# Altium footprint library Chronos.PcbLib: 65 footprints (part 4 of 5)
Each footprint in its own frame and in the unit in brackets; x right, y up, seen from the top. Pads: shape width x height; smd on the part's side, far side on the other; paste and mask are expansions set on the pad; w line width, h text height; cw(c..) or ccw(c..) is an arc to the next point about the centre after c.
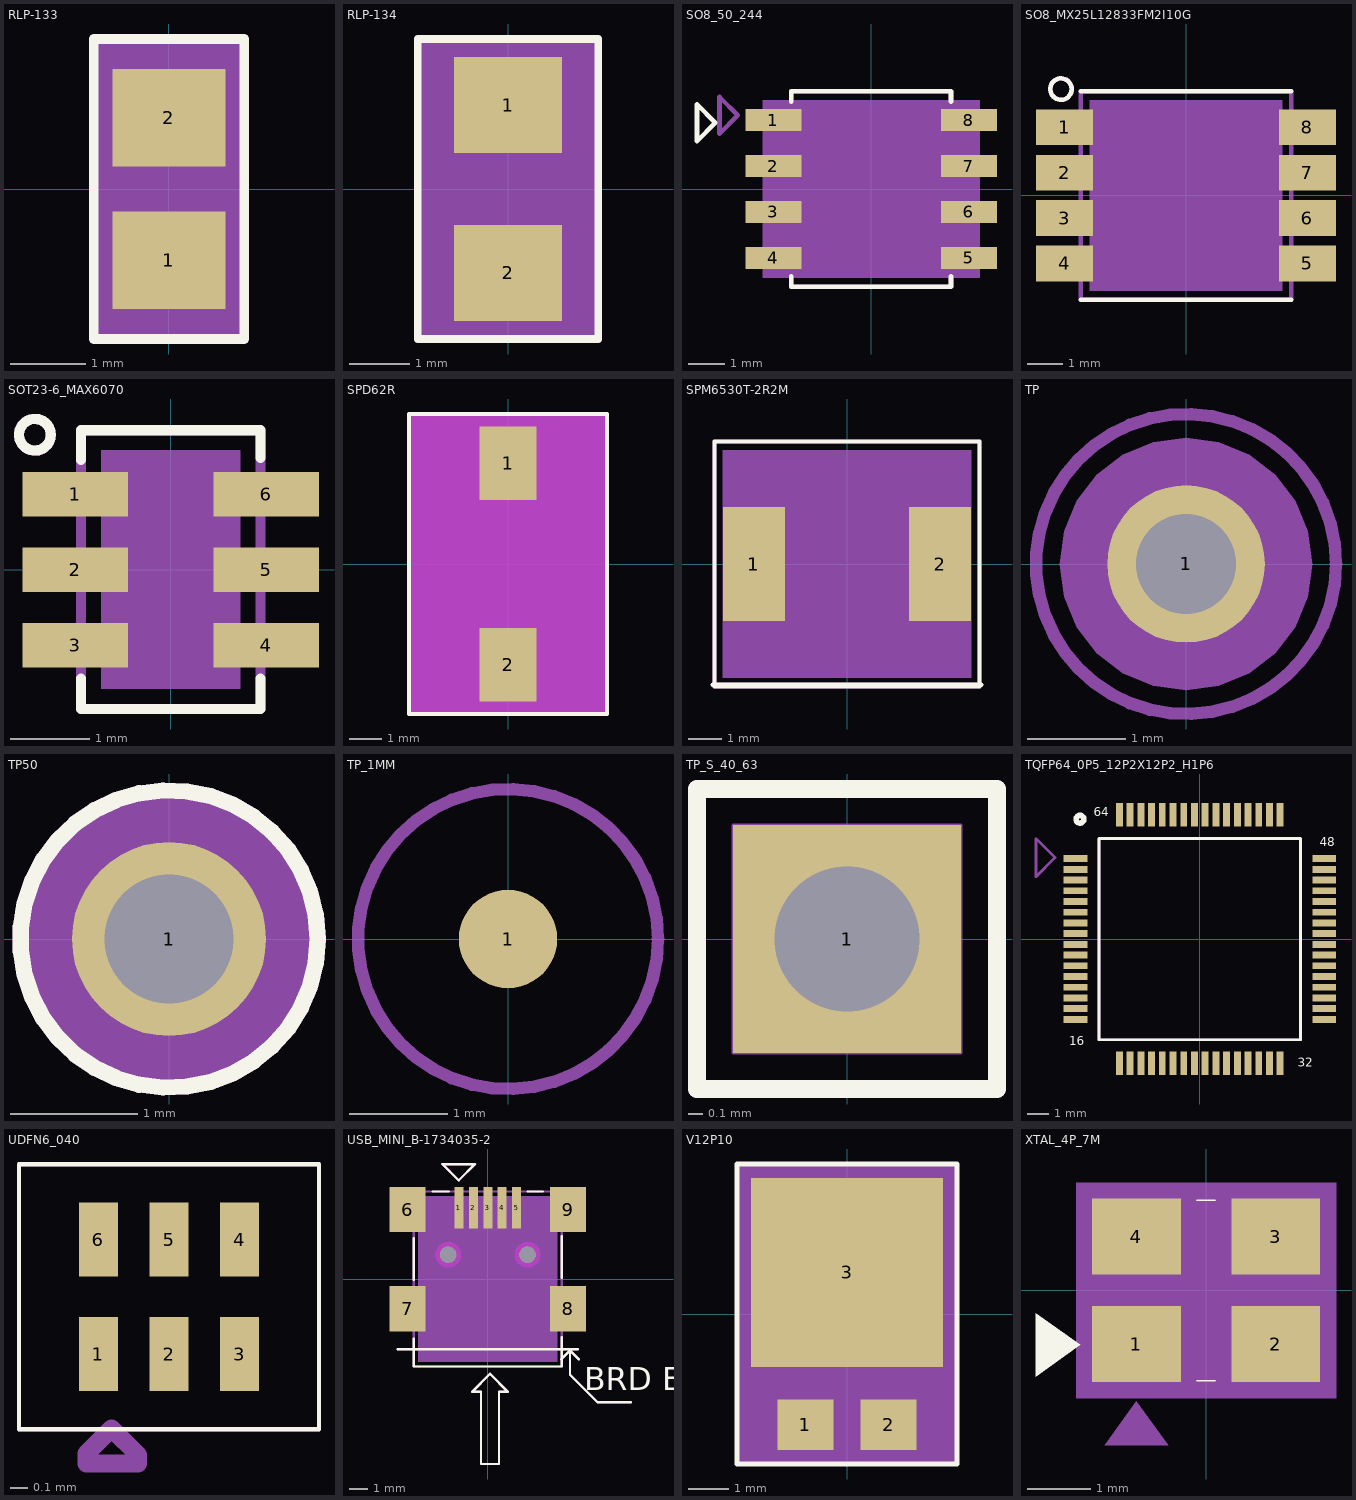
[diagram p3: the footprints below, top view; thin cyan lines are the x and y axes]

## RLP-133 [mm] "RLP-133"
pads (2):
  rect 1.5x1.3 smd: 1(0,-0.95) 2(0,0.95)
Top Overlay:
  lines w0.127: -1.001,-1.999 1.001,-1.999 1.001,1.999 -1.001,1.999 -1.001,-1.999
Top 3D Body:
  region: 1.001,1.999 1.001,-1.999 -1.001,-1.999 -1.001,1.999
Mechanical 29:
  text "2" at 0,0.442 h0.64
  text "1" at 0,-1.458 h0.64
3D body "CAP 0805.STEP": height 1.27, standoff 0, extent -0.637,-1 0.637,1

## RLP-134 [mm] "RLP-134"
pads (2):
  rect 1.8x1.6 smd: 1(0,1.399) 2(0,-1.399)
Top Overlay:
  lines w0.127: -1.501,-2.499 1.501,-2.499 1.501,2.499 -1.501,2.499 -1.501,-2.499
Top 3D Body:
  region: -1.501,-2.499 -1.501,2.499 1.501,2.499 1.501,-2.499
Mechanical 29:
  text "2" at 0,-1.907 h0.64
  text "1" at 0,0.891 h0.64
3D body "CAP 1206.STEP": height 1.65, standoff 0.03, extent -0.862,-1.6 0.762,1.6

## SO8_50_244 [mm] "SO8_50_244"
pads (8):
  rect 1.55x0.6 smd: 1(-2.7,1.905) 2(-2.7,0.635) 3(-2.7,-0.635) 4(-2.7,-1.905) 5(2.7,-1.905) 6(2.7,-0.635) 7(2.7,0.635) 8(2.7,1.905)
Top Overlay:
  lines w0.127: -2.204,-2.413 -2.204,-2.704 2.204,-2.704 2.204,-2.413 ; -2.204,2.413 -2.204,2.704 2.204,2.704 2.204,2.413 ; -4.811,1.321 -4.811,2.337 -4.303,1.829 -4.811,1.321
  text ".Designator" at -5.185,0.694 h1.02
Top 3D Body:
  region: -3,2.45 -3,-2.45 3,-2.45 3,2.45
Top Assembly:
  lines w0.127: -2.204,-2.413 -2.204,-2.704 2.204,-2.704 2.204,-2.413 ; -2.204,2.413 -2.204,2.704 2.204,2.704 2.204,2.413 ; -4.191,1.524 -4.191,2.54 -3.683,2.032 -4.191,1.524
Mechanical 29:
  text "4" at -2.497,-1.905 h0.51
  text "6" at 2.903,-0.635 h0.51
  text "8" at 2.903,1.905 h0.51
  text "1" at -2.497,1.905 h0.51
  text "2" at -2.497,0.635 h0.51
  text "3" at -2.497,-0.635 h0.51
  text "5" at 2.903,-1.905 h0.51
  text "7" at 2.903,0.635 h0.51
3D body "93LC56C-I_SN.STEP": height 1.75, standoff 0, extent -3,-2.45 3,2.45

## SO8_MX25L12833FM2I10G [mm] "SO8_MX25L12833FM2I10G"
pads (8):
  rect 1.6x1 smd: 1(-3.4,1.905) 2(-3.4,0.635) 3(-3.4,-0.635) 4(-3.4,-1.905) 5(3.4,-1.905) 6(3.4,-0.635) 7(3.4,0.635) 8(3.4,1.905)
Top Overlay:
  circle w0.127: c-3.502,2.976 r0.3
  lines w0.127: -2.944,-2.919 2.944,-2.919 ; -2.944,2.919 2.944,2.919
  text ".Designator" at 5.498,-2.6 h1.02
Top 3D Body:
  region: -2.69,2.665 -2.69,-2.665 2.69,-2.665 2.69,2.665
Top Assembly:
  circle w0.127: c-3.502,2.976 r0.3
  lines w0.127: -2.944,-2.919 2.944,-2.919 2.944,2.919 -2.944,2.919 -2.944,-2.919
Mechanical 29:
  text "4" at -3.4,-2.108 h0.51
  text "8" at 3.4,1.702 h0.51
  text "6" at 3.4,-0.838 h0.51
  text "3" at -3.4,-0.838 h0.51
  text "7" at 3.4,0.432 h0.51
  text "2" at -3.4,0.432 h0.51
  text "5" at 3.4,-2.108 h0.51
  text "1" at -3.4,1.702 h0.51
3D body "SOP-8.step": height 1.83, standoff 0, extent -3.227,-2.5 2.973,2.5

## SOT23-6_MAX6070 [mm] "SOT23-6_MAX6070"
pads (6):
  rect 1.33x0.56 smd: 1(-1.2,0.95) 2(-1.2,0) 3(-1.2,-0.95) 4(1.2,-0.95) 5(1.2,0) 6(1.2,0.95)
Top Overlay:
  circle w0.127: c-1.708,1.697 r0.2
  lines w0.127: -1.129,-1.369 -1.129,-1.754 1.129,-1.754 1.129,-1.369 ; -1.129,1.378 -1.129,1.754 1.129,1.754 1.129,1.402
  text ".Designator" at 0.603,-2.127 h1.02
Top 3D Body:
  region: 0.875,-1.5 0.875,1.5 -0.875,1.5 -0.875,-1.5
Top Assembly:
  circle w0.127: c-1.708,1.697 r0.2
  lines w0.127: -1.129,-1.754 -1.129,1.754 1.129,1.754 1.129,-1.754 -1.129,-1.754
Mechanical 29:
  text "6" at 1.2,0.747 h0.51
  text "5" at 1.2,-0.203 h0.51
  text "1" at -1.2,0.747 h0.51
  text "3" at -1.2,-1.153 h0.51
  text "4" at 1.2,-1.153 h0.51
  text "2" at -1.2,-0.203 h0.51
3D body: height 3.81, standoff 0, extent -0.875,-1.5 0.875,1.5

## SPD62R [mm] "SPD62R"
pads (2):
  rect 1.8x2.3 smd: 1(0,3.15) 2(0,-3.15)
Mid-Layer 1 keep-out:
  region: -3.048,4.699 -3.048,-4.699 3.048,-4.699 3.048,4.699
Mid-Layer 2 keep-out:
  region: -3.048,4.699 -3.048,-4.699 3.048,-4.699 3.048,4.699
Top Overlay:
  lines w0.127: -3.099,-4.699 -3.099,4.699 3.099,4.699 3.099,-4.699 -3.099,-4.699
Top 3D Body:
  region: -3.099,4.699 -3.099,-4.699 3.099,-4.699 3.099,4.699
Mechanical 29:
  text "2" at -0.508,-3.15 h0.64
  text "1" at -0.508,3.15 h0.64
3D body "Download_WE-PD_6033_STP+(rev1) (1).stp": height 2.9, standoff 0, extent -3.1,-2.823 3.1,3.077

## SPM6530T-2R2M [mm] "SPM6530T-2R2M"
pads (2):
  rect 1.85x3.4 smd: 1(-2.775,0) 2(2.775,0)
Top Overlay:
  lines w0.127: -4.004,-3.604 4.004,-3.604 ; -3.954,-3.654 -3.954,3.654 3.954,3.654 3.954,-3.654 -3.954,-3.654
  text ".Designator" at 2.612,-4.01 h1.02
Top 3D Body:
  region: 3.7,-3.4 3.7,3.4 -3.7,3.4 -3.7,-3.4
Top Assembly:
  lines w0.127: -4.004,-3.604 4.004,-3.604 ; -3.954,-3.654 -3.954,3.654 3.954,3.654 3.954,-3.654 -3.954,-3.654
Mechanical 29:
  text "2" at 2.775,-0.203 h0.51
  text "1" at -2.775,-0.203 h0.51
3D body "Bourns SRR6028.STEP": height 2.7, standoff -0.1, extent -3.4,-3.4 3.4,3.4

## TP [mil] "TP"
pads (1):
  round 63 hole 40: 1(0,0)
Top 3D Body:
  region: 0,-50.43 13.05,-48.71 25.22,-43.67 35.66,-35.66 43.67,-25.22 48.71,-13.05 50.43,0 48.71,13.05 43.67,25.22 35.66,35.66 25.22,43.67 13.05,48.71 0,50.43 -13.05,48.71 -25.22,43.67 -35.66,35.66 -43.67,25.22 -48.71,13.05 -50.43,0 -48.71,-13.05 -43.67,-25.22 -35.66,-35.66 -25.22,-43.67 -13.05,-48.71
Top Assembly:
  circle w5: c0,0 r60
  text ".Designator" at 100,100 h40
Mechanical 29:
  text "1" at 0,20 h25
Mechanical39:
  circle w5: c0,0 r60
3D body: height 150, standoff 0, extent -50.43,-50.43 50.43,50.43

## TP50 [mil] "TP50"
pads (1):
  round 60 hole 40: 1(0,0)
Top Overlay:
  circle w5: c0,0 r45.96
Top 3D Body:
  region: 0,46.36 -12,44.78 -23.18,40.15 -32.78,32.78 -40.15,23.18 -44.78,12 -46.36,0 -44.78,-12 -40.15,-23.18 -32.78,-32.78 -23.18,-40.15 -12,-44.78 0,-46.36 12,-44.78 23.18,-40.15 32.78,-32.78 40.15,-23.18 44.78,-12 46.36,0 44.78,12 40.15,23.18 32.78,32.78 23.18,40.15 12,44.78
Top Assembly:
  circle w5: c0,0 r45.96
  text ".Designator" at 0,100 h45
Mechanical 29:
  text "1" at 0,-36 h45
3D body: height 150, standoff 0, extent -46.36,-46.36 46.36,46.36

## TP_1MM [mm] "TP"
pads (1):
  round 1 smd: 1(0,0)
Top Assembly:
  circle w0.127: c0,0 r1.524
  text ".Designator" at 2.54,2.54 h1.02
Mechanical 29:
  text "1" at 0,0.508 h0.64
Mechanical39:
  circle w0.127: c0,0 r1.524

## TP_S_40_63 [mil] "TP_S_40_63"
pads (1):
  rect 63x63 hole 40: 1(0,0)
Top Overlay:
  lines w5: -41.5,-41.5 -41.5,41.5 41.5,41.5 41.5,-41.5 -41.5,-41.5
  text ".Designator" at 50.47,-12.74 h40
Top 3D Body:
  lines w1: -31.5,-31.5 -31.5,31.5 31.5,31.5 31.5,-31.5 -31.5,-31.5
Top Assembly:
  lines w5: -41.5,-41.5 -41.5,41.5 41.5,41.5 41.5,-41.5 -41.5,-41.5
Mechanical 29:
  text "1" at -8,0 h20

## TQFP64_0P5_12P2X12P2_H1P6 [mm] "TQFP64_0P5_12P2X12P2_H1P6"
pads (64):
  rect 1.108x0.321 smd: 1(-5.8,3.75) 2(-5.8,3.25) 3(-5.8,2.75) 4(-5.8,2.25) 5(-5.8,1.75) 6(-5.8,1.25) 7(-5.8,0.75) 8(-5.8,0.25) 9(-5.8,-0.25) 10(-5.8,-0.75) 11(-5.8,-1.25) 12(-5.8,-1.75) 13(-5.8,-2.25) 14(-5.8,-2.75) 15(-5.8,-3.25) 16(-5.8,-3.75) 33(5.8,-3.75) 34(5.8,-3.25) 35(5.8,-2.75) 36(5.8,-2.25) 37(5.8,-1.75) 38(5.8,-1.25) 39(5.8,-0.75) 40(5.8,-0.25) 41(5.8,0.25) 42(5.8,0.75) 43(5.8,1.25) 44(5.8,1.75) 45(5.8,2.25) 46(5.8,2.75) 47(5.8,3.25) 48(5.8,3.75)
  rect 0.321x1.108 smd: 17(-3.75,-5.8) 18(-3.25,-5.8) 19(-2.75,-5.8) 20(-2.25,-5.8) 21(-1.75,-5.8) 22(-1.25,-5.8) 23(-0.75,-5.8) 24(-0.25,-5.8) 25(0.25,-5.8) 26(0.75,-5.8) 27(1.25,-5.8) 28(1.75,-5.8) 29(2.25,-5.8) 30(2.75,-5.8) 31(3.25,-5.8) 32(3.75,-5.8) 49(3.75,5.8) 50(3.25,5.8) 51(2.75,5.8) 52(2.25,5.8) 53(1.75,5.8) 54(1.25,5.8) 55(0.75,5.8) 56(0.25,5.8) 57(-0.25,5.8) 58(-0.75,5.8) 59(-1.25,5.8) 60(-1.75,5.8) 61(-2.25,5.8) 62(-2.75,5.8) 63(-3.25,5.8) 64(-3.75,5.8)
Top Overlay:
  lines w0.127: -4.699,-4.706 -4.699,4.692 4.699,4.692 4.699,-4.706 -4.699,-4.706
  lines w0.254: -5.414,5.544 cw(c-5.588,5.588) -5.408,5.588
  text "48" at 5.588,4.318 h0.41
  text "32" at 4.572,-5.969 h0.41
  text "16" at -6.096,-4.953 h0.41
  text ".Designator" at 3.302,-7.62 h1.02
  text "64" at -4.953,5.715 h0.41
Top Assembly:
  lines w0.127: -7.642,2.903 -6.753,3.792 -7.642,4.681 -7.642,2.903 ; -4.7,-4.706 -4.7,4.692 4.698,4.692 4.698,-4.706 -4.7,-4.706
  text "64" at -4.097,6.633 h0.51
  text "49" at 3.43,6.677 h0.51
  text "48" at 6.537,3.488 h0.51
  text "33" at 6.834,-4.008 h0.51
  text "32" at 3.402,-7.112 h0.51
  text "17" at -4.179,-7.269 h0.51
  text "16" at -7.488,-3.974 h0.51
Mechanical 29:
  text "27" at 1.656,-5.8 h0.51
  text "28" at 2.157,-5.8 h0.51
  text "29" at 2.656,-5.8 h0.51
  text "30" at 3.157,-5.8 h0.51
  text "32" at 4.157,-5.8 h0.51
  text "33" at 6.206,-3.75 h0.51
  text "34" at 6.206,-3.25 h0.51
  text "21" at -1.344,-5.8 h0.51
  text "22" at -0.844,-5.8 h0.51
  text "23" at -0.344,-5.8 h0.51
  text "48" at 6.206,3.75 h0.51
  text "52" at 2.656,5.8 h0.51
  text "53" at 2.157,5.8 h0.51
  text "54" at 1.656,5.8 h0.51
  text "55" at 1.156,5.8 h0.51
  text "57" at 0.156,5.8 h0.51
  text "58" at -0.344,5.8 h0.51
  text "59" at -0.844,5.8 h0.51
  text "60" at -1.344,5.8 h0.51
  text "36" at 6.206,-2.25 h0.51
  text "51" at 3.157,5.8 h0.51
  text "35" at 6.206,-2.75 h0.51
  text "10" at -5.394,-0.75 h0.51
  text "5" at -5.597,1.75 h0.51
  text "13" at -5.394,-2.25 h0.51
  text "15" at -5.394,-3.25 h0.51
  text "11" at -5.394,-1.25 h0.51
  text "25" at 0.656,-5.8 h0.51
  text "1" at -5.597,3.75 h0.51
  text "47" at 6.206,3.25 h0.51
  text "61" at -1.844,5.8 h0.51
  text "18" at -2.844,-5.8 h0.51
  text "9" at -5.597,-0.25 h0.51
  text "12" at -5.394,-1.75 h0.51
  text "37" at 6.206,-1.75 h0.51
  text "64" at -3.344,5.8 h0.51
  text "49" at 4.157,5.8 h0.51
  text "16" at -5.394,-3.75 h0.51
  text "62" at -2.344,5.8 h0.51
  text "17" at -3.344,-5.8 h0.51
  text "63" at -2.844,5.8 h0.51
  text "19" at -2.344,-5.8 h0.51
  text "6" at -5.597,1.25 h0.51
  text "2" at -5.597,3.25 h0.51
  text "4" at -5.597,2.25 h0.51
  text "14" at -5.394,-2.75 h0.51
  text "3" at -5.597,2.75 h0.51
  text "39" at 6.206,-0.75 h0.51
  text "26" at 1.156,-5.8 h0.51
  text "44" at 6.206,1.75 h0.51
  text "41" at 6.206,0.25 h0.51
  text "46" at 6.206,2.75 h0.51
  text "43" at 6.206,1.25 h0.51
  text "45" at 6.206,2.25 h0.51
  text "20" at -1.844,-5.8 h0.51
  text "31" at 3.656,-5.8 h0.51
  text "56" at 0.656,5.8 h0.51
  text "42" at 6.206,0.75 h0.51
  text "50" at 3.656,5.8 h0.51
  text "40" at 6.206,-0.25 h0.51
  text "38" at 6.206,-1.25 h0.51
  text "8" at -5.597,0.25 h0.51
  text "7" at -5.597,0.75 h0.51
  text "24" at 0.156,-5.8 h0.51
3D body "LQFP-64-10x10.STEP": height 1.55, standoff 0, extent -6.01,-6.01 6.01,6.01

## UDFN6_040 [mm] "UDFN6_040"
pads (6):
  rect 0.22x0.42 smd: 1(7.245,-4.389) 2(7.645,-4.389) 3(8.045,-4.389) 4(8.045,-3.739) 5(7.645,-3.739) 6(7.245,-3.739)
Top Overlay:
  lines w0.025: 6.794,-4.815 6.945,-4.815 8.496,-4.815 8.496,-3.313 6.794,-3.313 6.794,-4.815
  text ".Designator" at 9.677,-5.39 h1.02
Top Assembly:
  lines w0.025: 6.794,-4.815 6.794,-3.313 8.496,-3.313 8.496,-4.815 6.794,-4.815
  lines w0.102: 7.177,-5.01 7.177,-4.952 7.319,-4.811 7.471,-4.962 7.471,-5.008 7.469,-5.01 7.177,-5.01
Mechanical 29:
  text "1" at 7.245,-5.202 h1.02
  text "6" at 7.245,-4.552 h1.02
  text "2" at 7.645,-5.202 h1.02
  text "5" at 7.645,-4.552 h1.02
  text "3" at 8.045,-5.202 h1.02
  text "4" at 8.045,-4.552 h1.02
3D body "UDFN6_1P2X1_ONS.step": height 0.56, standoff 0, extent 7.052,-4.551 8.246,-3.561

## USB_MINI_B-1734035-2 [mm] "USB_MINI_B-1734035-2"
pads (11):
  rect 0.5x2.3 smd: 1(-1.6,3.95) 2(-0.8,3.95) 3(0,3.95) 4(0.8,3.95) 5(1.6,3.95)
  rect 2x2.5 smd: 6(-4.45,3.85) 7(-4.45,-1.65) 8(4.45,-1.65) 9(4.45,3.85)
  round 0.9 hole 0.9 unplated: ""(-2.2,1.35) ""(2.2,1.35)
Top Overlay:
  lines w0.127: -5,-3.9 5,-3.9 ; -4.104,-3.301 -4.104,-4.854 4.104,-4.854 4.104,-3.219 ; -4.104,-0.035 -4.104,2.278 ; -3.062,4.854 -2.164,4.854 ; 2.218,4.854 3.062,4.854 ; 4.057,-4.469 4.557,-3.969 ; 4.104,0.074 4.104,2.387 ; 5.057,-4.469 4.557,-3.969 ; 7.94,-6.838 6.08,-6.838 4.557,-5.315 4.557,-3.969 ; -2.523,6.375 -1.621,5.473 -1.615,5.473 -0.714,6.374 -2.517,6.374 -2.523,6.38 -2.523,6.375 ; -0.876,-6.26 -0.375,-6.26 -0.375,-10.26 0.625,-10.26 0.625,-6.26 1.125,-6.26 0.125,-5.26 -0.876,-6.26
  text "BRD EDGE" at 5.341,-6.174 h1.27
Top 3D Body:
  region: -3.85,4.6 -3.85,-4.6 3.85,-4.6 3.85,4.6
Multi-Layer keep-out:
  region: 2.2,0.64 2.384,0.664 2.555,0.735 2.702,0.848 2.815,0.995 2.886,1.166 2.91,1.35 2.886,1.534 2.815,1.705 2.702,1.852 2.555,1.965 2.384,2.036 2.2,2.06 2.016,2.036 1.845,1.965 1.698,1.852 1.585,1.705 1.514,1.534 1.49,1.35 1.514,1.166 1.585,0.995 1.698,0.848 1.845,0.735 2.016,0.664
  region: -2.2,0.64 -2.016,0.664 -1.845,0.735 -1.698,0.848 -1.585,0.995 -1.514,1.166 -1.49,1.35 -1.514,1.534 -1.585,1.705 -1.698,1.852 -1.845,1.965 -2.016,2.036 -2.2,2.06 -2.384,2.036 -2.555,1.965 -2.702,1.852 -2.815,1.705 -2.886,1.534 -2.91,1.35 -2.886,1.166 -2.815,0.995 -2.702,0.848 -2.555,0.735 -2.384,0.664
Top Assembly:
  lines w0.127: -5,-3.9 5,-3.9 ; 4.057,-4.469 4.557,-3.969 ; 5.057,-4.469 4.557,-3.969 ; 7.94,-6.838 6.08,-6.838 4.557,-5.315 4.557,-3.969 ; -4.104,-4.854 4.104,-4.854 4.104,4.854 -4.104,4.854 -4.104,-4.854 ; -2.509,6.375 -1.606,5.473 -1.6,5.473 -0.699,6.374 -2.503,6.374 -2.509,6.38 -2.509,6.375 ; -0.876,-6.26 -0.375,-6.26 -0.375,-10.26 0.625,-10.26 0.625,-6.26 1.125,-6.26 0.125,-5.26 -0.876,-6.26
  text "BRD EDGE" at 5.341,-6.174 h1.27
  text ".Designator" at -0.184,10.041 h1.02
Mechanical 29:
  text "4" at 0.8,4.153 h0.51
  text "5" at 1.6,4.153 h0.51
  text "7" at -4.45,-1.447 h0.51
  text "6" at -4.45,4.053 h0.51
  text "8" at 4.45,-1.447 h0.51
  text "9" at 4.45,4.053 h0.51
  text "1" at -1.6,4.153 h0.51
  text "3" at 0,4.153 h0.51
  text "2" at -0.8,4.153 h0.51
3D body: height 3.81, standoff 0, extent -3.85,-4.6 3.85,4.6

## V12P10 [mm] "V12P10"
pads (3):
  rect 1.4x1.27 smd: 1(-1.039,-2.766) 2(1.039,-2.766)
  rect 4.8x4.72 smd: 3(0,1.039)
Top Overlay:
  lines w0.127: -2.751,-3.749 2.751,-3.749 2.751,3.749 -2.751,3.749 -2.751,-3.749
Top 3D Body:
  region: -2.751,3.749 -2.751,-3.749 2.751,-3.749 2.751,3.749
Mechanical 29:
  text "1" at -1.547,-2.766 h0.64
  text "2" at 0.531,-2.766 h0.64
  text "3" at -0.508,1.039 h0.64
3D body "V12P10-M3_86A.STEP": height 1.2, standoff 0, extent -2.306,-3.23 2.294,3.27

## XTAL_4P_7M [mm] "XTAL_4P_7M"
pads (4):
  rect 1.4x1.2 smd: 1(-1.1,-0.85) 2(1.1,-0.85) 3(1.1,0.85) 4(-1.1,0.85)
Top Overlay:
  dashed: -1.989,-0.862 -2.689,-0.362 -2.689,-1.362
  lines w0.025: -0.146,-1.427 0.146,-1.427 ; -0.146,1.427 0.146,1.427
Top 3D Body:
  region: -2.054,-1.704 2.054,-1.704 2.054,1.704 -2.054,1.704
Top Assembly:
  dashed: -1.1,-1.75 -1.6,-2.45 -0.6,-2.45
  lines w0.025: -1.65,-1.3 -1.65,1.3 1.65,1.3 1.65,-1.3 -1.65,-1.3
  text ".Designator" at -2.159,-0.762 h1.02
Mechanical 29:
  text "2" at 1.1,-0.444 h1.02
  text "4" at -1.1,1.256 h1.02
  text "1" at -1.1,-0.444 h1.02
  text "3" at 1.1,1.256 h1.02
Mechanical33:
  text "SYM HEIGHT  = 0.8mm" at -9.959,11.042 h1.52
  text "SYMBOL NAME = xtal_4p_7m" at -9.679,15.512 h1.52
  text "PADSTACK:s1_4x1_2" at -9.73,13.328 h1.52
Mechanical34:
  text "MFG:TXC" at -9.314,-12.092 h1.52
  text "MFG P/N:7M" at -9.314,-14.124 h1.52
Mechanical35:
  text "Axelsys" at -9.365,-9.933 h1.52
3D body "7M-12.000MAAJ-T.STEP": height 0.8, standoff 0, extent -1.6,-1.25 1.6,1.25